# Altium footprint library lib_eps.PcbLib: 113 footprints (part 5 of 8)
Each footprint in its own frame and in the unit in brackets; x right, y up, seen from the top. Pads: shape width x height; smd on the part's side, far side on the other; paste and mask are expansions set on the pad; w line width, h text height; cw(c..) or ccw(c..) is an arc to the next point about the centre after c.
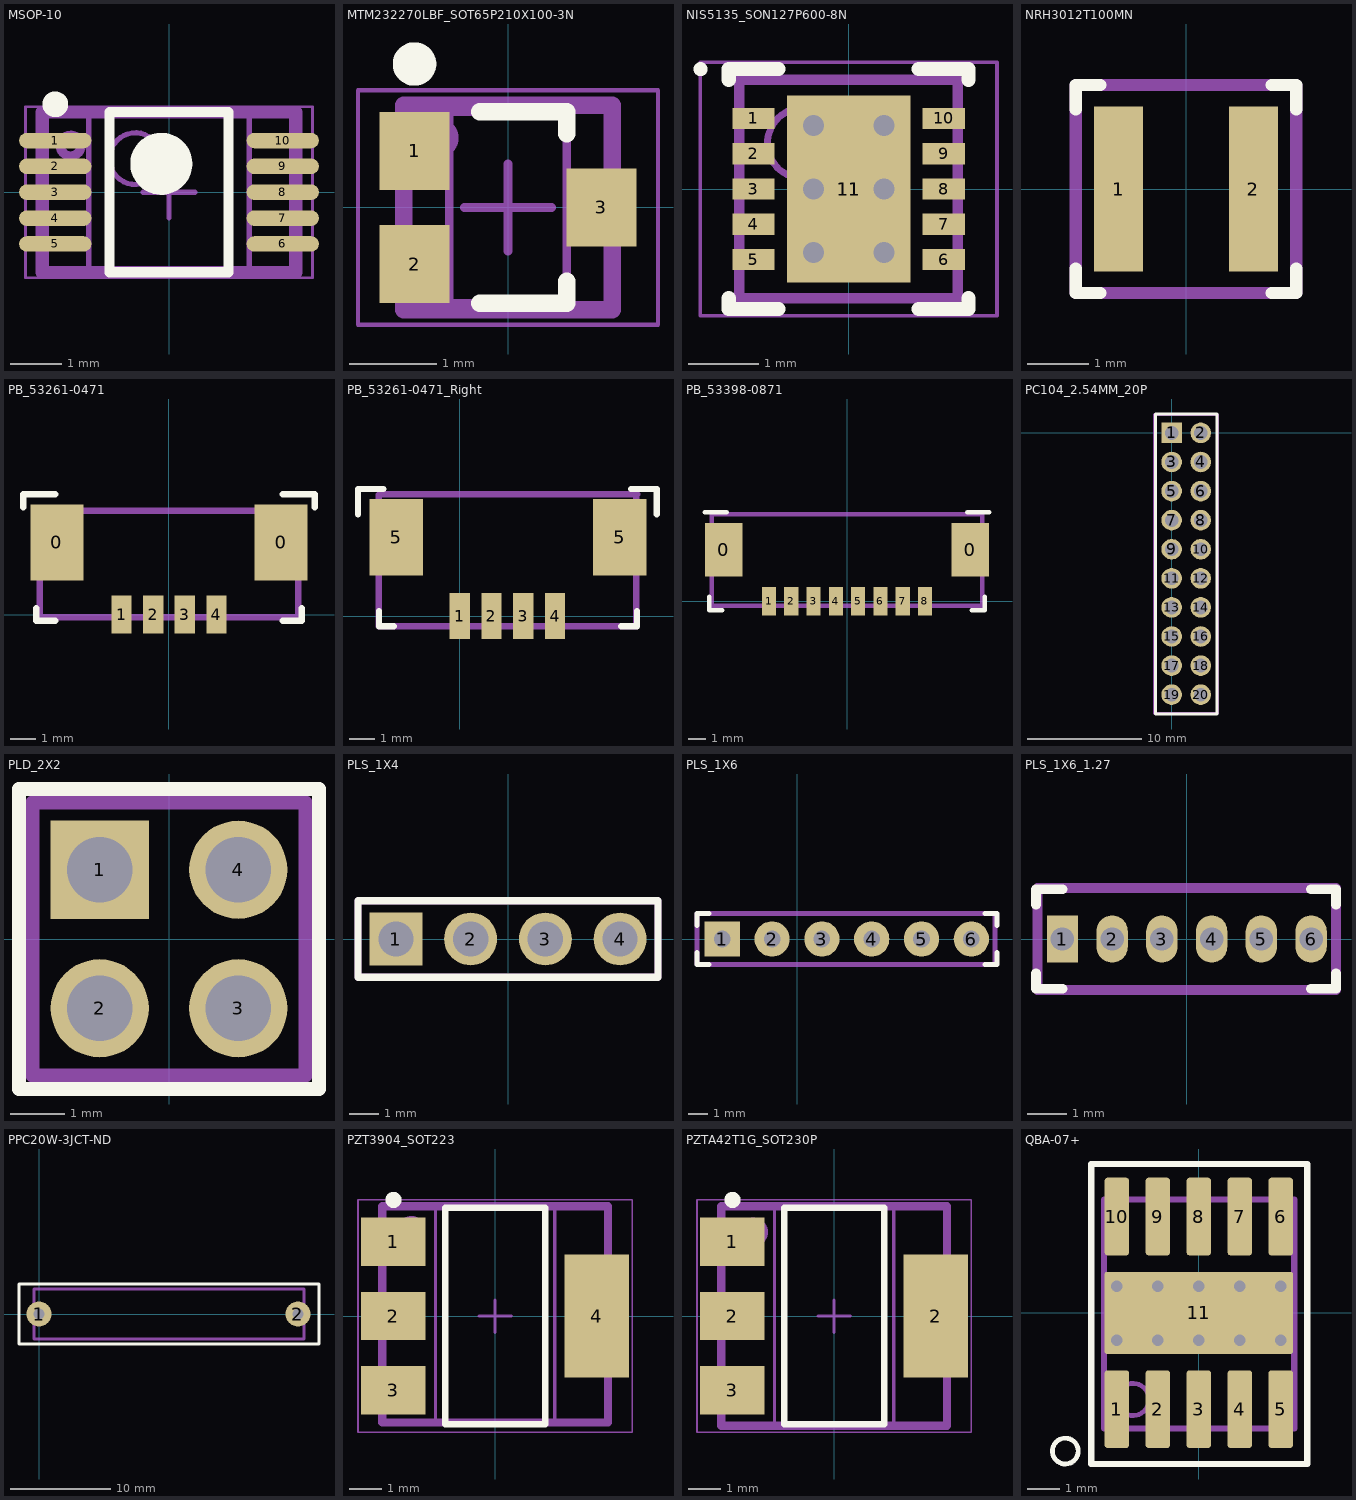
[diagram p4: the footprints below, top view; thin cyan lines are the x and y axes]

## MSOP-10 [mm] "TSSOP, 10-Leads, Body 3.00x3.00mm, Pitch 0.50mm, IPC High Density"
height 0.95
pads (10):
  oval 1.4x0.3 smd mask+0.051: 1(-2.2,1) 2(-2.2,0.5) 3(-2.2,0) 4(-2.2,-0.5) 5(-2.2,-1) 6(2.2,-1) 7(2.2,-0.5) 8(2.2,0) 9(2.2,0.5) 10(2.2,1)
Top Overlay:
  circle w0.25: c-2.2,1.7 r0.125
  circle w0.6: c-0.15,0.55 r0.3
  lines w0.2: -1.15,-1.55 -1.15,1.55 1.15,1.55 1.15,-1.55 -1.15,-1.55
Mechanical 13:
  circle w0.1: c-0.65,0.65 r0.5
  lines w0.1: -1.55,-1.55 -1.55,1.55 1.55,1.55 1.55,-1.55 -1.55,-1.55
Mechanical 15:
  lines w0.05: -2.775,-1.65 -2.775,1.65 2.775,1.65 2.775,-1.65 -2.775,-1.65
  lines w0.1: -0.5,0 0.5,0 ; 0,-0.5 0,0.5
Mechanical 29:
  circle w0.18: c-1.9,0.9 r0.2
  lines w0.254: -2.45,-1.55 -2.45,1.55 2.45,1.55 2.45,-1.55 -2.45,-1.55
  text "'.Designator'" at -1.9,-0.2 h0.6
3D body "MSOP-10.step": height 0.95, standoff 0, extent -2.45,-1.55 2.45,1.55

## MTM232270LBF_SOT65P210X100-3N [mm] "SOT23, 3-Leads, Body 2,00x2,10mm, Pitch 0,65mm, IPC Medium Density"
height 1
pads (3):
  rect 0.8x0.9 smd: 1(-1.075,0.65) 2(-1.075,-0.65) 3(1.075,0)
Top Overlay:
  circle w0.25: c-1.075,1.65 r0.125
  lines w0.2: -0.325,-1.1 0.675,-1.1 0.675,-0.85 ; -0.325,1.1 0.675,1.1 0.675,0.85
Mechanical 13:
  lines w0.1: -0.675,-1.1 0.675,-1.1 0.675,1.1 -0.675,1.1 -0.675,-1.1
Mechanical 15:
  lines w0.05: -1.725,-1.35 1.725,-1.35 1.725,1.35 -1.725,1.35 -1.725,-1.35
  lines w0.1: -0.5,0 0.5,0 ; 0,-0.5 0,0.5
Mechanical 29:
  circle w0.18: c-0.8,0.8 r0.141
  lines w0.2: -1.2,-1.175 1.2,-1.175 1.2,1.175 -1.2,1.175 -1.2,-1.175
  text "'.Designator'" at -0.8,-0.3 h0.6
3D body "MTM232270LBF_SOT65P210X100-3N.step": height 1, standoff 0, extent -1.2,-1.1 1.2,1.1

## NIS5135_SON127P600-8N [mm]
height 0.63
pads (12):
  rect 0.6x0.3 smd mask+0.051: 1(-1.35,1) 2(-1.35,0.5) 3(-1.35,0) 4(-1.35,-0.5) 5(-1.35,-1) 6(1.35,-1) 7(1.35,-0.5) 8(1.35,0) 9(1.35,0.5) 10(1.35,1)
  rect 1.75x2.65 smd mask+0.051: 11(0,0)
  rect 1.6x2.5 smd far side mask+0.051: 11(0,0)
via 0.5,-0.9 diameter 0.605 hole 0.3
via -0.5,-0.9 diameter 0.605 hole 0.3
via 0.5,0 diameter 0.605 hole 0.3
via -0.5,0 diameter 0.605 hole 0.3
via 0.5,0.9 diameter 0.605 hole 0.3
via -0.5,0.9 diameter 0.605 hole 0.3
Top Overlay:
  circle w0.1: c-2.1,1.7 r0.05
  lines w0.2: -1.7,-1.55 -1.7,-1.7 -0.995,-1.7 ; -1.7,1.55 -1.7,1.7 -0.995,1.7 ; 0.995,-1.7 1.7,-1.7 1.7,-1.55 ; 0.995,1.7 1.7,1.7 1.7,1.55
Mechanical 13:
  circle w0.1: c-0.65,0.65 r0.5
  lines w0.1: -1.55,-1.55 -1.55,1.55 1.55,1.55 1.55,-1.55 -1.55,-1.55
Mechanical 15:
  lines w0.05: -2.105,-1.8 -2.105,1.8 2.105,1.8 2.105,-1.8 -2.105,-1.8
  lines w0.1: -0.5,0 0.5,0 ; 0,-0.5 0,0.5
Mechanical 29:
  lines w0.15: -1.55,-1.55 -1.55,1.55 1.55,1.55 1.55,-1.55 -1.55,-1.55
  text "'.Designator'" at -1.3,-0.5 h1
3D body "SON127P600-8N.step": height 0.63, standoff 0, extent -1.6,-1.55 1.6,1.55

## NRH3012T100MN [mm] "0.118\" L x 0.118\" W (3.00mm x 3.00mm)"
height 47
pads (2):
  rect 0.8x2.7 smd: 1(-1.1,0) 2(1.1,0)
Top Overlay:
  lines w0.2: -1.8,-1.3 -1.8,-1.7 -1.4,-1.7 ; -1.8,1.3 -1.8,1.7 -1.4,1.7 ; 1.4,-1.7 1.8,-1.7 1.8,-1.3 ; 1.4,1.7 1.8,1.7 1.8,1.3
Mechanical 29:
  lines w0.2: -1.8,-1.7 -1.8,1.7 1.8,1.7 1.8,-1.7 -1.8,-1.7
  text "'.Designator'" at -1.1,-0.1 h0.6
3D body "IND_TAIYO_NRH3012.step": height 1.19, standoff 0, extent -1.549,-1.552 1.549,1.552

## PB_53261-0471 [mm]
pads (6):
  rect 2.1x3 smd: 0(-4.425,2.85) 0(4.425,2.85)
  rect 0.8x1.5 smd: 1(-1.875,0) 2(-0.625,0) 3(0.625,0) 4(1.875,0)
Top Overlay:
  lines w0.254: -5.75,4.25 -5.75,4.75 -4.5,4.75 ; -5.25,0.25 -5.25,-0.25 -4.5,-0.25 ; 4.5,-0.25 5.25,-0.25 5.25,0.25 ; 4.5,4.75 5.75,4.75 5.75,4.25
Mechanical 29:
  lines w0.254: -5.1,-0.1 5.1,-0.1 5.1,4.1 -5.1,4.1 -5.1,1.3 -5.1,-0.1
  text "'.Designator'" at -2.7,1.9 h0.6
3D body "533980471.stp": height 4.72, standoff -0.02, extent -5.075,-0.1 5.075,4.1

## PB_53261-0471_Right [mm]
pads (6):
  rect 0.8x1.8 smd: 1(0,0) 2(1.25,0) 3(2.5,0) 4(3.75,0)
  rect 2.1x3 smd: 5(-2.5,3.1) 5(6.3,3.1)
Top Overlay:
  lines w0.25: -4,4 -4,5 -3,5 ; -3.175,0.2 -3.175,-0.4 -2.6,-0.4 ; 6.35,-0.4 6.6,-0.4 6.975,-0.4 6.975,0.2 ; 6.75,5 7.75,5 7.75,4
Mechanical 29:
  lines w0.254: -3.175,-0.4 6.95,-0.4 6.95,4.775 6.975,4.8 -3.15,4.8 -3.175,4.775 -3.175,-0.4
  text "'.Designator'" at -1.425,1.975 h1.5
3D body "532610471.stp": height 3.4, standoff 0, extent -3.175,-0.4 6.975,4.8

## PB_53398-0871 [mm] "Headers & Wire Housings 1.25MM HDR 8 CKT Right-Angle"
height 3.5
pads (10):
  rect 2.1x3 smd: 0(-6.925,2.9) 0(6.925,2.9)
  rect 0.8x1.6 smd: 1(-4.375,0) 2(-3.125,0) 3(-1.875,0) 4(-0.625,0) 5(0.625,0) 6(1.875,0) 7(3.125,0) 8(4.375,0)
Top Overlay:
  lines w0.254: -8,5 -6.75,5 ; -7.75,0.25 -7.75,-0.5 -7,-0.5 ; 6.75,5 8,5 ; 7,-0.5 7.75,-0.5 7.75,0.25
Mechanical 29:
  lines w0.254: -7.6,-0.25 -7.6,1.1 -7.6,4.9 7.6,4.9 7.6,-0.25 -7.6,-0.25
  text "'.Designator'" at -3.2,2.1 h0.6
3D body "532610871.stp": height 3.4, standoff 0, extent -7.575,-0.325 7.575,4.875

## PC104_2.54MM_20P [mm] "CONN SOCKET 20POS 0.1 TIN PCB"
height 0.231
pads (20):
  rect 1.8x1.8 hole 1.2: 1(0,0)
  round 1.8 hole 1.2: 2(2.54,0) 3(0,-2.54) 4(2.54,-2.54) 5(0,-5.08) 6(2.54,-5.08) 7(0,-7.62) 8(2.54,-7.62) 9(0,-10.16) 10(2.54,-10.16) 11(0,-12.7) 12(2.54,-12.7) 13(0,-15.24) 14(2.54,-15.24) 15(0,-17.78) 16(2.54,-17.78) 17(0,-20.32) 18(2.54,-20.32) 19(0,-22.86) 20(2.54,-22.86)
Top Overlay:
  lines w0.254: -1.425,-24.55 3.95,-24.55 3.95,1.65 -1.425,1.65 -1.425,-24.55
Mechanical 29:
  lines w0.254: -1.5,-24.5 -1.5,1.6 4,1.6 4,-24.5 -1.25,-24.5 -1.5,-24.5
  text "'.Designator'" at 2.1,-19.8 h1.52
3D body "ESQ-110-14-L-D.stp": height 11.11, standoff -12.13, extent -1.29,-24.408 3.79,1.5

## PLD_2X2 [mm] "CONN SOCKET 20POS 0.1 TIN PCB"
height 0.231
pads (4):
  rect 1.8x1.8 hole 1.2: 1(-1.27,1.27)
  round 1.8 hole 1.2: 2(-1.27,-1.27) 3(1.27,-1.27) 4(1.27,1.27)
Top Overlay:
  lines w0.254: -2.75,-2.75 2.75,-2.75 2.75,2.75 -2.75,2.75 -2.75,2.5 -2.75,-2.75
Mechanical 29:
  lines w0.254: -2.5,-2.5 2.5,-2.5 2.5,2.5 -2.5,2.5 -2.5,-2.5
  text "'.Designator'" at -2,-0.1 h0.6
3D body "DS1021-2x2SF11.stp": height 8.6, standoff -3, extent -2.5,-2.54 2.5,2.54

## PLS_1X4 [mm] "CONN SOCKET 20POS 0.1 TIN PCB"
height 0.231
pads (4):
  rect 1.8x1.8 hole 1.2: 1(-3.81,0)
  round 1.8 hole 1.2: 2(-1.27,0) 3(1.27,0) 4(3.81,0)
Top Overlay:
  lines w0.254: -5.1,-1.3 5.1,-1.3 5.1,1.3 -3.82,1.3 -5.1,1.3 -5.1,-1.3
Mechanical 29:
  lines w0.254: -5.1,-1.3 5.1,-1.3 5.1,1.3 -5.1,1.3 -5.1,-1.3
  text "'.Designator'" at -3.1,-0.2 h0.6
3D body "DS1021-1x4SF11.stp": height 8.7, standoff -2.9, extent -5.08,-1.27 5.08,1.27

## PLS_1X6 [mm] "CONN SOCKET 20POS 0.1 TIN PCB"
height 0.231
pads (6):
  rect 1.8x1.8 hole 0.85: 1(-3.81,0)
  round 1.8 hole 0.85: 2(-1.27,0) 3(1.27,0) 4(3.81,0) 5(6.35,0) 6(8.89,0)
Top Overlay:
  lines w0.254: -5.1,-0.7 -5.1,-1.3 -4.5,-1.3 ; -5.1,0.7 -5.1,1.3 -4.5,1.3 ; 9.6,-1.3 10.2,-1.3 10.2,-0.7 ; 9.6,1.3 10.2,1.3 10.2,0.7
Mechanical 29:
  lines w0.254: -5.1,-1.3 5.05,-1.3 10.1,-1.3 10.1,1.3 5.1,1.3 -5.1,1.3 -5.1,-1.3
  text "'.Designator'" at -3.1,-0.2 h0.6
3D body "DS1021-1x6SF11.stp": height 8.6, standoff -3, extent -5.08,-1.27 10.16,1.27

## PLS_1X6_1.27 [mm] "3.10mm, 4.60mm, 5.40mm"
height 0.231
pads (6):
  rect 0.8x1.2 hole 0.6 mask+0.051: 1(-3.175,0)
  oval 0.8x1.2 hole 0.6 mask+0.051: 2(-1.905,0) 3(-0.635,0) 4(0.635,0) 5(1.905,0) 6(3.175,0)
Top Overlay:
  lines w0.254: -3.85,-0.875 -3.85,-1.27 -3.175,-1.27 ; -3.85,0.875 -3.85,1.27 ; -3.81,1.27 -3.175,1.27 ; 3.175,-1.27 3.81,-1.27 3.81,-0.875 ; 3.175,1.27 3.81,1.27 3.81,0.875
Mechanical 29:
  lines w0.254: -3.81,-1.3 2.51,-1.3 3.81,-1.3 3.81,1.3 2.56,1.3 -3.81,1.3 -3.81,-1.3
  text "'.Designator'" at -3.5,-0.25 h0.6
3D body "DS1031-01-1x6P8BV3-1.stp": height 4.6, standoff -2.6, extent -3.81,-1.25 3.81,1.25

## PPC20W-3JCT-ND [mm] "RES 20 OHM 3W 5% AXIAL"
pads (2):
  round 2.5 hole 1.1: 1(0,0) 2(25.9,0)
Top Overlay:
  lines w0.254: -2,-3 -2,3 0.5,3 28,3 28,-3 -2,-3
Mechanical 29:
  lines w0.254: -0.5,-2.5 26.5,-2.5 26.5,2.5 -0.5,2.5 -0.5,-2.5
  text "'.Designator'" at 4.5,-0.5 h1.52
3D body "PR03.step": height 5.2, standoff -0.72, extent -0.415,-2.6 26.555,2.6

## PZT3904_SOT223 [mm]
height 1.75
pads (4):
  rect 2x1.5 smd: 1(-3.15,2.3) 2(-3.15,0) 3(-3.15,-2.3)
  rect 2x3.8 smd: 4(3.15,0)
Top Overlay:
  circle w0.25: c-3.15,3.6 r0.125
  lines w0.2: -1.55,-3.35 -1.55,3.35 1.55,3.35 1.55,-3.35 -1.55,-3.35
Mechanical 13:
  lines w0.1: -1.85,-3.35 -1.85,3.35 1.85,3.35 1.85,-3.35 -1.85,-3.35
Mechanical 15:
  lines w0.05: -4.25,-3.6 -4.25,3.6 4.25,3.6 4.25,-3.6 -4.25,-3.6
  lines w0.1: -0.5,0 0.5,0 ; 0,-0.5 0,0.5
Mechanical 29:
  circle w0.18: c-2.6,2.7 r0.316
  lines w0.254: -3.5,-3.3 3.5,-3.3 3.5,3.4 -3.5,3.4 -3.5,-3.3
  text "'.Designator'" at -2.9,-0.6 h1.52
3D body "PZT3904_SOT223.step": height 1.75, standoff 0, extent -3.5,-3.35 3.5,3.35

## PZTA42T1G_SOT230P [mm] "SOT223, 4-Leads, Body 6,50x7,00mm (avg), Pitch 2,30mm, IPC Medium Density"
height 1.75
pads (4):
  rect 2x1.5 smd: 1(-3.15,2.3) 2(-3.15,0) 3(-3.15,-2.3)
  rect 2x3.8 smd: 2(3.15,0)
Top Overlay:
  circle w0.25: c-3.15,3.6 r0.125
  lines w0.2: -1.55,-3.35 -1.55,3.35 1.55,3.35 1.55,-3.35 -1.55,-3.35
Mechanical 13:
  lines w0.1: -1.85,-3.35 -1.85,3.35 1.85,3.35 1.85,-3.35 -1.85,-3.35
Mechanical 15:
  lines w0.05: -4.25,-3.6 -4.25,3.6 4.25,3.6 4.25,-3.6 -4.25,-3.6
  lines w0.1: -0.5,0 0.5,0 ; 0,-0.5 0,0.5
Mechanical 29:
  circle w0.18: c-2.5,2.6 r0.361
  lines w0.254: -3.5,-3.4 3.5,-3.4 3.5,3.4 -3.5,3.4 -3.5,-3.4
  text "'.Designator'" at -0.8,3 h1.52
3D body "PZTA42T1G_SOT230P.step": height 1.75, standoff 0, extent -3.5,-3.35 3.5,3.35

## QBA-07+ [mm]
height 1.78
pads (11):
  rrect25% 0.76x2.41 smd: 1(-2.54,-2.985) 2(-1.27,-2.985) 3(0,-2.985) 4(1.27,-2.985) 5(2.54,-2.985) 6(2.54,2.985) 7(1.27,2.985) 8(0,2.985) 9(-1.27,2.985) 10(-2.54,2.985)
  rrect5% 5.84x2.54 smd: 11(0,0)
via -2.54,0.825 diameter 0.665 hole 0.36
via -1.27,0.825 diameter 0.665 hole 0.36
via 0,0.825 diameter 0.665 hole 0.36
via 1.27,0.825 diameter 0.665 hole 0.36
via 2.54,0.825 diameter 0.665 hole 0.36
via 2.54,-0.845 diameter 0.665 hole 0.36
via 1.27,-0.845 diameter 0.665 hole 0.36
via 0,-0.845 diameter 0.665 hole 0.36
via -1.27,-0.845 diameter 0.665 hole 0.36
via -2.54,-0.845 diameter 0.665 hole 0.36
Top Overlay:
  circle w0.15: c-4.14,-4.285 r0.4
  lines w0.2: -3.34,-4.685 -3.34,4.615 3.36,4.615 3.36,-4.685 -3.34,-4.685
Mechanical 29:
  circle w0.15: c-2.04,-2.685 r0.5
  lines w0.2: -2.94,-3.585 2.96,-3.585 2.96,3.515 -2.94,3.515 -2.94,-3.585
  text "'.Designator'" at 0.76,-2.285 h1.4
3D body "qba-07+.stp": height 1.1, standoff 0, extent -3.81,-3.67 3.81,3.67